# Altium footprint library 4.49-接插件.PcbLib: 262 footprints (part 13 of 17)
Each footprint in its own frame and in the unit in brackets; x right, y up, seen from the top. Pads: shape width x height; smd on the part's side, far side on the other; paste and mask are expansions set on the pad; w line width, h text height; cw(c..) or ccw(c..) is an arc to the next point about the centre after c.
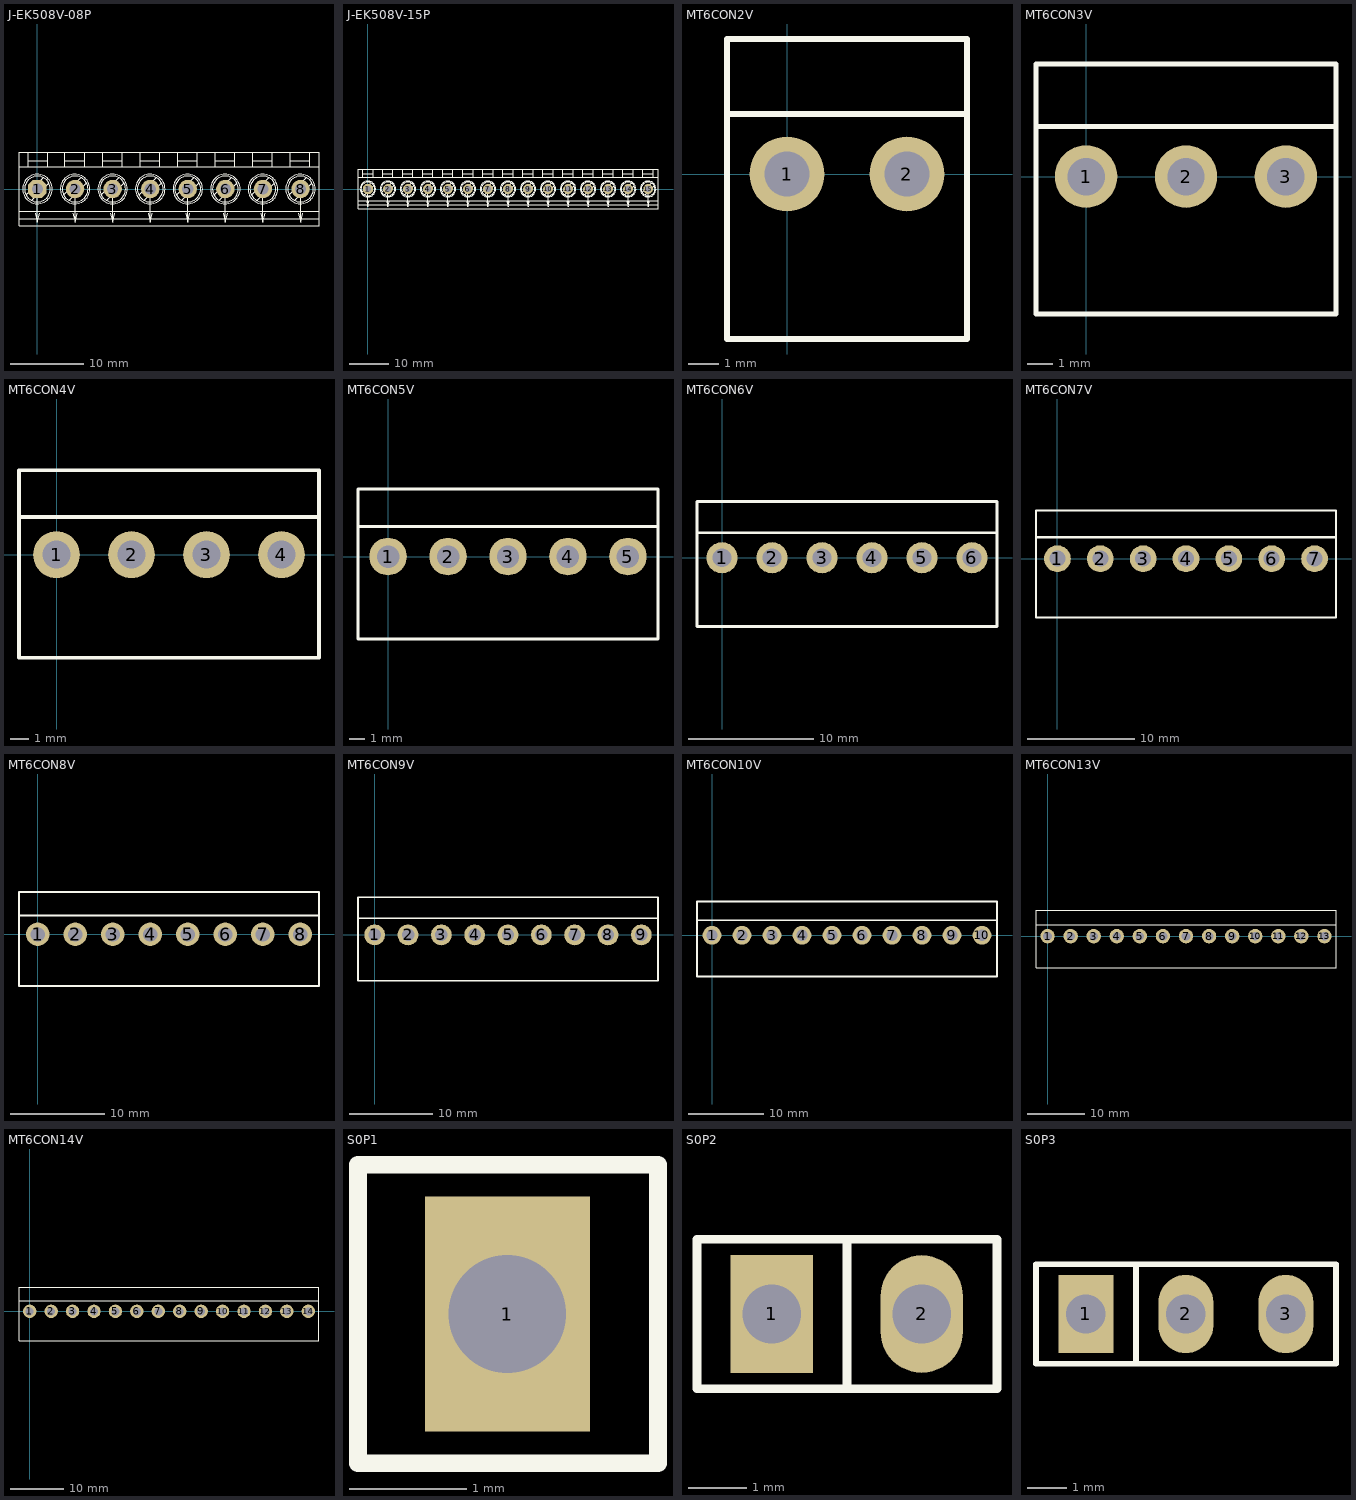
[diagram p12: the footprints below, top view; thin cyan lines are the x and y axes]

## J-EK508V-08P [mm]
pads (8):
  oct 2.5x2.5 hole 1.5: 1(0,0)
  round 2.5 hole 1.5: 2(5.08,0) 3(10.16,0) 4(15.24,0) 5(20.32,0) 6(25.4,0) 7(30.48,0) 8(35.56,0)
Top Overlay:
  circle w0.15: c30.48,0 r1.75
  circle w0.15: c30.48,0 r2
  circle w0.15: c35.56,0 r2
  circle w0.15: c35.56,0 r1.75
  circle w0.15: c25.4,0 r1.75
  circle w0.15: c25.4,0 r2
  circle w0.15: c20.32,0 r2
  circle w0.15: c20.32,0 r1.75
  circle w0.15: c15.24,0 r1.75
  circle w0.15: c15.24,0 r2
  circle w0.15: c5.08,0 r2
  circle w0.15: c5.08,0 r1.75
  circle w0.15: c0,0 r2
  circle w0.15: c0,0 r1.75
  circle w0.15: c10.16,0 r1.75
  circle w0.15: c10.16,0 r2
  lines w0.15: -2.5,-4 38.06,-4 ; -2.5,-3 38.06,-3 ; -2.5,3 38.06,3 ; -1.513,-0.791 0.798,1.52 ; -1.281,3 -1.281,5 ; -1.281,3.839 1.361,3.839 ; -0.798,-1.52 1.513,0.791 ; -0.29,-3.298 0,-4.503 ; 0,0 0,-4.503 ; 0.29,-3.298 0,-4.503 ; 1.361,3 1.361,5 ; 3.567,-0.791 5.878,1.52 ; 3.719,3 3.719,5 ; 3.719,3.839 6.361,3.839 ; 4.282,-1.52 6.593,0.791 ; 4.79,-3.298 5.08,-4.503 ; 5.08,0 5.08,-4.503 ; 5.37,-3.298 5.08,-4.503 ; 6.361,3 6.361,5 ; 8.647,-0.791 10.958,1.52 ; 8.799,3 8.799,5 ; 8.799,3.839 11.441,3.839 ; 9.362,-1.52 11.673,0.791 ; 9.87,-3.298 10.16,-4.503 ; 10.16,0 10.16,-4.503 ; 10.45,-3.298 10.16,-4.503 ; 11.441,3 11.441,5 ; 13.727,-0.791 16.038,1.52 ; 13.879,3 13.879,5 ; 13.879,3.839 16.521,3.839 ; 14.442,-1.52 16.753,0.791 ; 14.95,-3.298 15.24,-4.503 ; 15.24,0 15.24,-4.503 ; 15.53,-3.298 15.24,-4.503 ; 16.521,3 16.521,5 ; 18.807,-0.791 21.118,1.52 ; 18.959,3 18.959,5 ; 18.959,3.839 21.601,3.839 ; 19.522,-1.52 21.833,0.791 ; 20.03,-3.298 20.32,-4.503 ; 20.32,0 20.32,-4.503 ; 20.61,-3.298 20.32,-4.503 ; 21.601,3 21.601,5 ; 23.887,-0.791 26.198,1.52 ; 24.039,3 24.039,5 ; 24.039,3.839 26.681,3.839 ; 24.602,-1.52 26.913,0.791 ; 25.11,-3.298 25.4,-4.503 ; 25.4,0 25.4,-4.503 ; 25.69,-3.298 25.4,-4.503 ; 26.681,3 26.681,5 ; 28.967,-0.791 31.278,1.52 ; 29.119,3 29.119,5 ; 29.119,3.839 31.761,3.839 ; 29.682,-1.52 31.993,0.791 ; 30.19,-3.298 30.48,-4.503 ; 30.48,0 30.48,-4.503 ; 30.77,-3.298 30.48,-4.503 ; 31.761,3 31.761,5 ; 34.047,-0.791 36.358,1.52 ; 34.199,3 34.199,5 ; 34.199,3.839 36.841,3.839 ; 34.762,-1.52 37.073,0.791 ; 35.27,-3.298 35.56,-4.503 ; 35.56,0 35.56,-4.503 ; 35.85,-3.298 35.56,-4.503 ; 36.841,3 36.841,5 ; -2.5,-5 38.06,-5 38.06,5 -2.5,5 -2.5,-5
3D body: height 8.64, standoff -1.91, extent 2.679,-10.747 8.902,-3.19
3D body: height 8.64, standoff -1.91, extent 11.62,-9.913 17.843,-4.693
3D body: height 8.64, standoff -1.91, extent 17.335,-3.15 38.035,3.073

## J-EK508V-15P [mm]
pads (15):
  oct 2.5x2.5 hole 1.5: 1(0,0)
  round 2.5 hole 1.5: 2(5.08,0) 3(10.16,0) 4(15.24,0) 5(20.32,0) 6(25.4,0) 7(30.48,0) 8(35.56,0) 9(40.64,0) 10(45.72,0) 11(50.8,0) 12(55.88,0) 13(60.96,0) 14(66.04,0) 15(71.12,0)
Top Overlay:
  drawing of 157 lines, arcs and shapes, not listed
3D body: height 13.8, standoff -3.5, extent -2.54,-5 73.66,5

## MT6CON2V [mm]
pads (2):
  round 2.5 hole 1.5: 1(0,0) 2(4,0)
Top Overlay:
  lines w0.203: -2,2 6,2 ; -2,-5.5 -2,4.5 6,4.5 6,-5.5 -2,-5.5
3D body: height 13.8, standoff -3.6, extent -1.96,-5.601 5.96,4.799

## MT6CON3V [mm]
pads (3):
  round 2.5 hole 1.5: 1(0,0) 2(4,0) 3(8,0)
Top Overlay:
  lines w0.203: -2,2 10,2 ; -2,-5.5 10,-5.5 10,4.5 -2,4.5 -2,-5.5
3D body: height 13.8, standoff -3.6, extent -1.94,-5.601 9.94,4.799

## MT6CON4V [mm]
pads (4):
  round 2.5 hole 1.5: 1(0,0) 2(4,0) 3(8,0) 4(12,0)
Top Overlay:
  lines w0.203: -2,2 14,2 ; -2,-5.5 -2,4.5 14,4.5 14,-5.5 -2,-5.5
3D body: height 13.8, standoff -3.6, extent -1.92,-5.601 13.92,4.799

## MT6CON5V [mm]
pads (5):
  round 2.5 hole 1.5: 1(0,0) 2(4,0) 3(8,0) 4(12,0) 5(16,0)
Top Overlay:
  lines w0.203: -2,2 18,2 ; -2,-5.5 -2,4.5 18,4.5 18,-5.5 -2,-5.5
3D body: height 13.8, standoff -3.6, extent -1.9,-5.601 17.9,4.799

## MT6CON6V [mm]
pads (6):
  round 2.5 hole 1.5: 1(0,0) 2(4,0) 3(8,0) 4(12,0) 5(16,0) 6(20,0)
Top Overlay:
  lines w0.203: -2,2 22,2 ; -2,-5.5 22,-5.5 22,4.5 -2,4.5 -2,-5.5
3D body: height 13.8, standoff -3.6, extent -1.88,-5.601 21.88,4.799

## MT6CON7V [mm]
pads (7):
  round 2.5 hole 1.5: 1(0,0) 2(4,0) 3(8,0) 4(12,0) 5(16,0) 6(20,0) 7(24,0)
Top Overlay:
  lines w0.203: -2,2 26,2 ; -2,-5.5 -2,4.5 26,4.5 26,-5.5 -2,-5.5
3D body: height 13.8, standoff -3.6, extent -1.86,-5.601 25.86,4.799

## MT6CON8V [mm]
pads (8):
  round 2.5 hole 1.5: 1(0,0) 2(4,0) 3(8,0) 4(12,0) 5(16,0) 6(20,0) 7(24,0) 8(28,0)
Top Overlay:
  lines w0.203: -2,2 30,2 ; -2,-5.5 -2,4.5 30,4.5 30,-5.5 -2,-5.5
3D body: height 13.8, standoff -3.6, extent -1.84,-5.601 29.84,4.799

## MT6CON9V [mm]
pads (9):
  round 2.5 hole 1.5: 1(0,0) 2(4,0) 3(8,0) 4(12,0) 5(16,0) 6(20,0) 7(24,0) 8(28,0) 9(32,0)
Top Overlay:
  lines w0.203: -2,2 34,2 ; -2,-5.5 34,-5.5 34,4.5 -2,4.5 -2,-5.5
3D body: height 13.8, standoff -3.6, extent -1.82,-5.601 33.82,4.799

## MT6CON10V [mm]
pads (10):
  round 2.5 hole 1.5: 1(0,0) 2(4,0) 3(8,0) 4(12,0) 5(16,0) 6(20,0) 7(24,0) 8(28,0) 9(32,0) 10(36,0)
Top Overlay:
  lines w0.203: -2,2 38,2 ; -2,-5.5 38,-5.5 38,4.5 -2,4.5 -2,-5.5
3D body: height 13.8, standoff -3.6, extent -1.9,-5.601 37.9,4.799

## MT6CON13V [mm]
pads (13):
  round 2.5 hole 1.5: 1(0,0) 2(4,0) 3(8,0) 4(12,0) 5(16,0) 6(20,0) 7(24,0) 8(28,0) 9(32,0) 10(36,0) 11(40,0) 12(44,0) 13(48,0)
Top Overlay:
  lines w0.203: -2,2 50,2 ; -2,-5.5 50,-5.5 50,4.5 -2,4.5 -2,-5.5
3D body: height 13.8, standoff -3.6, extent -1.74,-5.601 49.74,4.799

## MT6CON14V [mm]
pads (14):
  round 2.5 hole 1.5: 1(0,0) 2(4,0) 3(8,0) 4(12,0) 5(16,0) 6(20,0) 7(24,0) 8(28,0) 9(32,0) 10(36,0) 11(40,0) 12(44,0) 13(48,0) 14(52,0)
Top Overlay:
  lines w0.203: -2,2 54,2 ; -2,-5.5 54,-5.5 54,4.5 -2,4.5 -2,-5.5
3D body: height 13.8, standoff -3.6, extent -1.72,-5.601 53.72,4.799

## S0P1 [mm]
pads (1):
  rect 1.4x2 hole 1: 1(50.8,101.6)
Top Overlay:
  lines w0.15: 52.06,100.33 49.53,100.33 49.53,102.87 52.07,102.87 ; 52.08,100.33 52.08,102.87

## S0P2 [mm]
pads (2):
  rect 1.4x2 hole 1: 1(50.8,101.6)
  oval 1.4x2 hole 1: 2(53.35,101.6)
Top Overlay:
  lines w0.15: 52.06,100.33 49.53,100.33 49.53,102.87 52.07,102.87 ; 54.61,100.33 52.08,100.33 52.08,102.87 54.62,102.87 ; 54.63,100.33 54.63,102.87
3D body: height 4.57, standoff -2.92, extent 49.54,100.33 54.62,102.87

## S0P3 [mm]
pads (3):
  rect 1.4x2 hole 1: 1(50.8,101.6)
  oval 1.4x2 hole 1: 2(53.35,101.6) 3(55.9,101.6)
Top Overlay:
  lines w0.15: 52.06,100.33 49.53,100.33 49.53,102.87 52.07,102.87 ; 54.61,100.33 52.08,100.33 52.08,102.87 54.62,102.87 ; 54.63,100.33 57.16,100.33 ; 54.63,102.87 57.17,102.87 ; 57.18,100.33 57.18,102.87